# Altium footprint library LED.PcbLib: 49 footprints (part 4 of 4)
Each footprint in its own frame and in the unit in brackets; x right, y up, seen from the top. Pads: shape width x height; smd on the part's side, far side on the other; paste and mask are expansions set on the pad; w line width, h text height; cw(c..) or ccw(c..) is an arc to the next point about the centre after c.
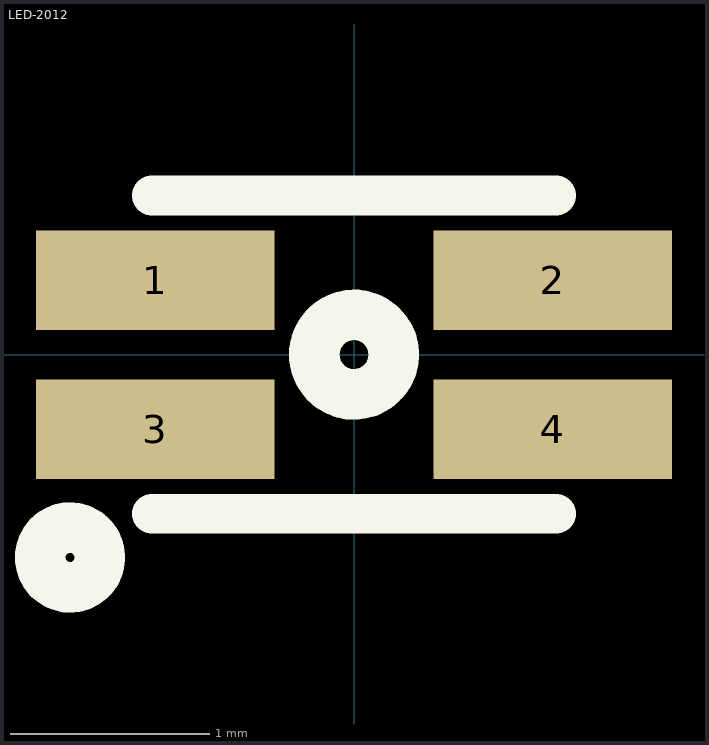
[diagram p3: the footprint, top view; thin cyan lines are the x and y axes]

## LED-2012 [mm]
pads (4):
  rect 1.2x0.5 smd: 1(-1,0.375) 2(1,0.375) 3(-1,-0.375) 4(1,-0.375)
Top Overlay:
  circle w0.254: c0,0 r0.2
  circle w0.254: c-1.428,-1.02 r0.15
  lines w0.2: -1.016,-0.8 1.016,-0.8 ; -1.016,0.8 1.016,0.8